# Altium footprint library Lib_001.PcbLib: 429 footprints (part 21 of 28)
Each footprint in its own frame and in the unit in brackets; x right, y up, seen from the top. Pads: shape width x height; smd on the part's side, far side on the other; paste and mask are expansions set on the pad; w line width, h text height; cw(c..) or ccw(c..) is an arc to the next point about the centre after c.
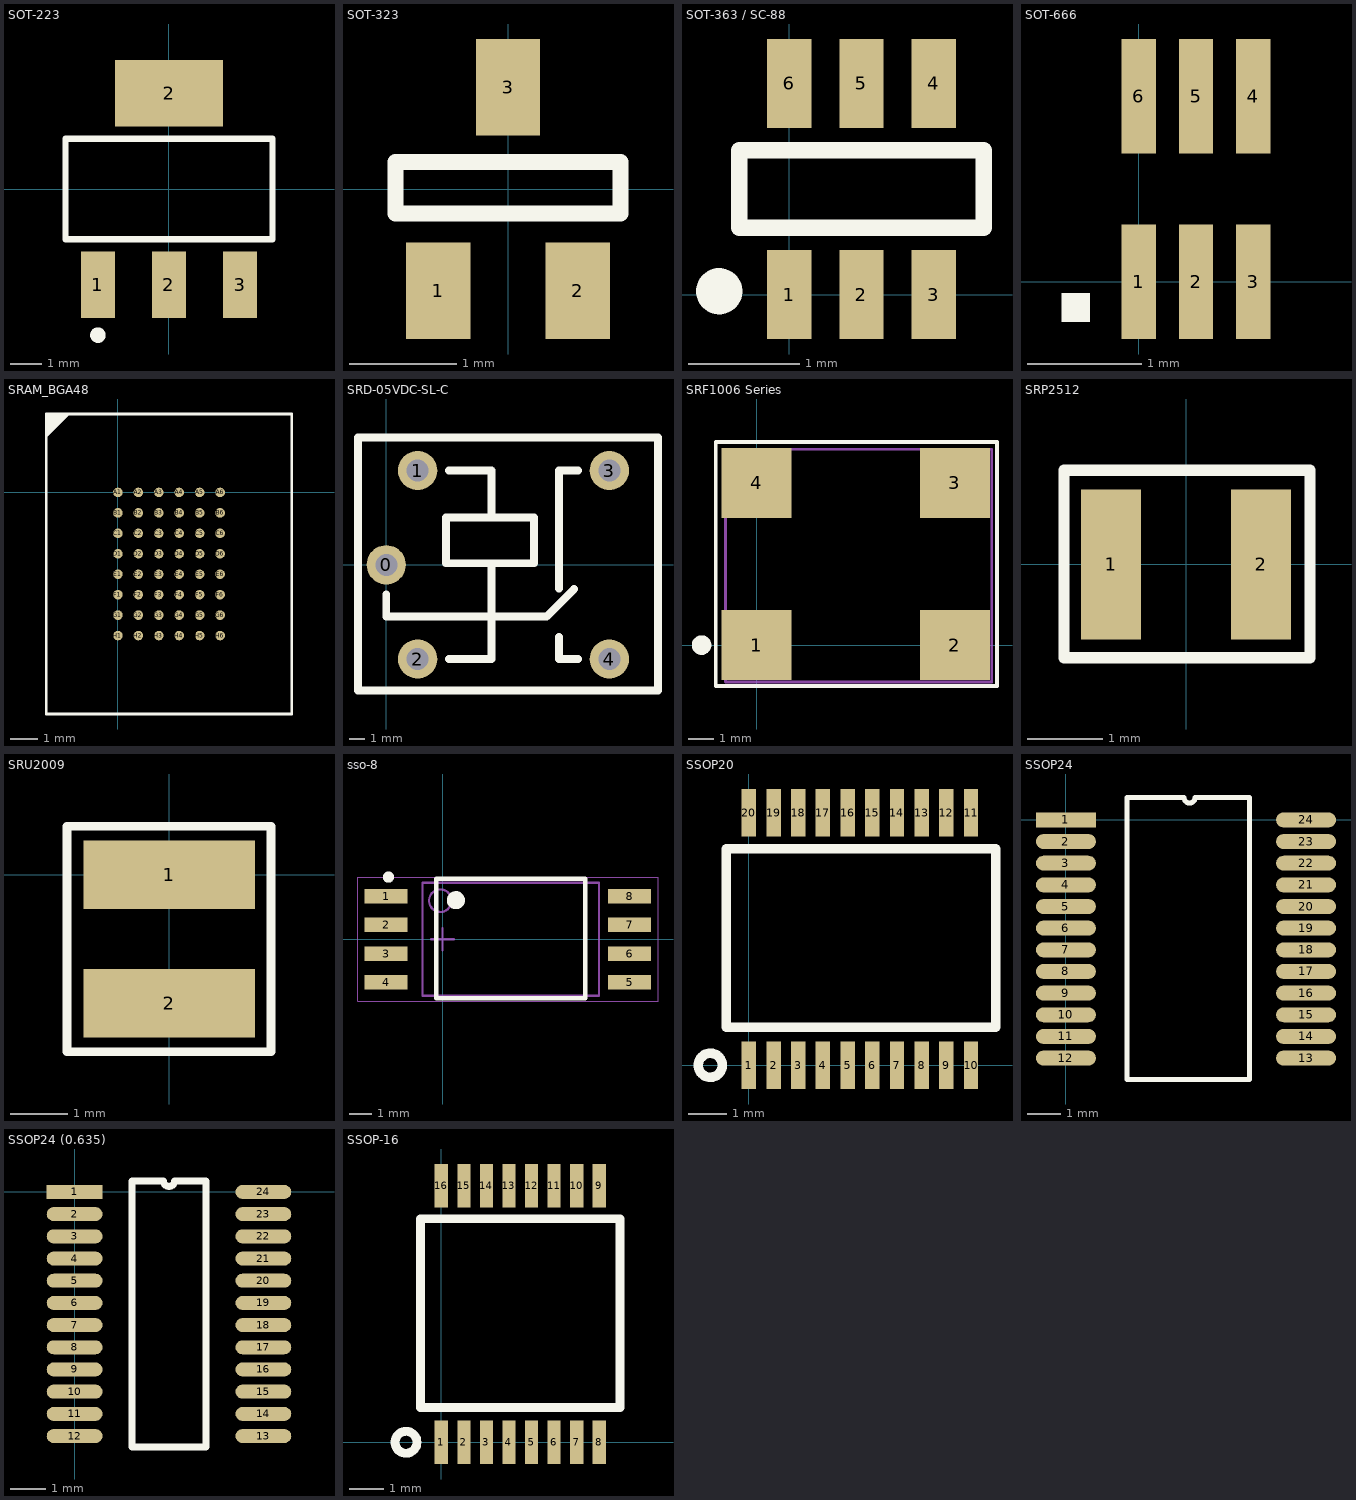
[diagram p20: the footprints below, top view; thin cyan lines are the x and y axes]

## SOT-223 [mm] "SOT-223/SC-73; 4 Leads; Body 6.7 x 7.3 mm, inc. leads (LxW max)"
height 1.8
pads (4):
  rect 1.1x2.15 smd: 1(-2.3,-3.1) 2(0,-3.1) 3(2.3,-3.1)
  rect 3.5x2.15 smd: 2(0,3.1)
Top Overlay:
  circle w0.25: c-2.3,-4.725 r0.125
  lines w0.2: -3.35,-1.625 -3.35,1.625 3.35,1.625 3.35,-1.625 -3.35,-1.625
3D body "User Library-SOT-223-4.STEP": height 1.65, standoff 0, extent -3.183,-3.894 3.317,3.192

## SOT-323 [mm]
pads (3):
  rect 0.6x0.9 smd: 1(-0.65,-0.95) 2(0.65,-0.95) 3(0,0.95)
Top Overlay:
  lines w0.15: -1.05,-0.23 1.05,-0.23 1.05,0.25 -1.05,0.25 -1.05,-0.23
3D body "User Library-sc70-3.STEP": height 1, standoff 0, extent -1.05,-1.15 1.05,1.15

## SOT-363 / SC-88 [mm]
pads (6):
  rect 0.4x0.8 smd: 1(0,0) 2(0.65,0) 3(1.3,0) 4(1.3,1.9) 5(0.65,1.9) 6(0,1.9)
Top Overlay:
  circle w0.254: c-0.63,0.03 r0.081
  lines w0.15: -0.45,0.6 -0.45,1.3 1.75,1.3 1.75,0.6 -0.45,0.6
3D body "User Library-SW3dPS-SOT363.step": height 0.98, standoff -0.01, extent -0.34,-0.1 1.66,2

## SOT-666 [mm]
pads (6):
  rect 0.3x1 smd: 1(0,0) 2(0.5,0) 3(1,0) 4(1,1.62) 5(0.5,1.62) 6(0,1.62)
Top Overlay:
  rectangle: -0.675,-0.35 -0.425,-0.1
3D body "User Library-SOT50P160X60-6.STEP": height 0.6, standoff 0, extent -0.295,0.025 1.296,1.625

## SRAM_BGA48 [mm]
pads (48):
  round 0.35 smd: A1(0,0) A2(0.75,0) A3(1.5,0) A4(2.25,0) A5(3,0) A6(3.75,0) B1(0,-0.75) B2(0.75,-0.75) B3(1.5,-0.75) B4(2.25,-0.75) B5(3,-0.75) B6(3.75,-0.75) C1(0,-1.5) C2(0.75,-1.5) C3(1.5,-1.5) C4(2.25,-1.5) C5(3,-1.5) C6(3.75,-1.5) D1(0,-2.25) D2(0.75,-2.25) D3(1.5,-2.25) D4(2.25,-2.25) D5(3,-2.25) D6(3.75,-2.25) E1(0,-3) E2(0.75,-3) E3(1.5,-3) E4(2.25,-3) E5(3,-3) E6(3.75,-3) F1(0,-3.75) F2(0.75,-3.75) F3(1.5,-3.75) F4(2.25,-3.75) F5(3,-3.75) F6(3.75,-3.75) G1(0,-4.5) G2(0.75,-4.5) G3(1.5,-4.5) G4(2.25,-4.5) G5(3,-4.5) G6(3.75,-4.5) H1(0,-5.25) H2(0.75,-5.25) H3(1.5,-5.25) H4(2.25,-5.25) H5(3,-5.25) H6(3.75,-5.25)
Top Overlay:
  region: -2.625,2.875 -1.755,2.875 -1.755,2.87 -2.625,2
  lines w0.1: -2.625,-8.125 6.375,-8.125 6.375,2.875 -2.625,2.875 -2.625,-8.125
3D body: height 1.2, standoff 0.24, extent -2.625,-8.125 6.375,2.875
3D body: height 0.34, standoff -0.14, extent -0.237,-3.239 0.24,-2.761
3D body: height 0.34, standoff -0.14, extent 0.513,-3.239 0.99,-2.761
3D body: height 0.34, standoff -0.14, extent 2.013,-3.239 2.49,-2.761
3D body: height 0.34, standoff -0.14, extent 1.263,-3.239 1.74,-2.761
3D body: height 0.34, standoff -0.14, extent 3.513,-3.239 3.99,-2.761
3D body: height 0.34, standoff -0.14, extent 2.763,-3.239 3.24,-2.761
3D body: height 0.34, standoff -0.14, extent 2.763,-3.989 3.24,-3.511
3D body: height 0.34, standoff -0.14, extent 3.513,-3.989 3.99,-3.511
3D body: height 0.34, standoff -0.14, extent 1.263,-3.989 1.74,-3.511
3D body: height 0.34, standoff -0.14, extent 2.013,-3.989 2.49,-3.511
3D body: height 0.34, standoff -0.14, extent 0.513,-3.989 0.99,-3.511
3D body: height 0.34, standoff -0.14, extent -0.237,-3.989 0.24,-3.511
3D body: height 0.34, standoff -0.14, extent -0.237,-5.489 0.24,-5.011
3D body: height 0.34, standoff -0.14, extent 0.513,-5.489 0.99,-5.011
3D body: height 0.34, standoff -0.14, extent 2.013,-5.489 2.49,-5.011
3D body: height 0.34, standoff -0.14, extent 1.263,-5.489 1.74,-5.011
3D body: height 0.34, standoff -0.14, extent 3.513,-5.489 3.99,-5.011
3D body: height 0.34, standoff -0.14, extent 2.763,-5.489 3.24,-5.011
3D body: height 0.34, standoff -0.14, extent 2.763,-4.739 3.24,-4.261
3D body: height 0.34, standoff -0.14, extent 3.513,-4.739 3.99,-4.261
3D body: height 0.34, standoff -0.14, extent 1.263,-4.739 1.74,-4.261
3D body: height 0.34, standoff -0.14, extent 2.013,-4.739 2.49,-4.261
3D body: height 0.34, standoff -0.14, extent 0.513,-4.739 0.99,-4.261
3D body: height 0.34, standoff -0.14, extent -0.237,-4.739 0.24,-4.261
3D body: height 0.34, standoff -0.14, extent -0.237,-1.739 0.24,-1.261
3D body: height 0.34, standoff -0.14, extent 0.513,-1.739 0.99,-1.261
3D body: height 0.34, standoff -0.14, extent 2.013,-1.739 2.49,-1.261
3D body: height 0.34, standoff -0.14, extent 1.263,-1.739 1.74,-1.261
3D body: height 0.34, standoff -0.14, extent 3.513,-1.739 3.99,-1.261
3D body: height 0.34, standoff -0.14, extent 2.763,-1.739 3.24,-1.261
3D body: height 0.34, standoff -0.14, extent 2.763,-2.489 3.24,-2.011
3D body: height 0.34, standoff -0.14, extent 3.513,-2.489 3.99,-2.011
3D body: height 0.34, standoff -0.14, extent 1.263,-2.489 1.74,-2.011
3D body: height 0.34, standoff -0.14, extent 2.013,-2.489 2.49,-2.011
3D body: height 0.34, standoff -0.14, extent 0.513,-2.489 0.99,-2.011
3D body: height 0.34, standoff -0.14, extent -0.237,-2.489 0.24,-2.011
3D body: height 0.34, standoff -0.14, extent -0.237,-0.989 0.24,-0.511
3D body: height 0.34, standoff -0.14, extent 0.513,-0.989 0.99,-0.511
3D body: height 0.34, standoff -0.14, extent 2.013,-0.989 2.49,-0.511
3D body: height 0.34, standoff -0.14, extent 1.263,-0.989 1.74,-0.511
3D body: height 0.34, standoff -0.14, extent 3.513,-0.989 3.99,-0.511
3D body: height 0.34, standoff -0.14, extent 2.763,-0.989 3.24,-0.511
3D body: height 0.34, standoff -0.14, extent 2.763,-0.239 3.24,0.239
3D body: height 0.34, standoff -0.14, extent 3.513,-0.239 3.99,0.239
3D body: height 0.34, standoff -0.14, extent 1.263,-0.239 1.74,0.239
3D body: height 0.34, standoff -0.14, extent 2.013,-0.239 2.49,0.239
3D body: height 0.28, standoff -0.08, extent 0.572,-0.179 0.93,0.179
3D body: height 0.28, standoff -0.08, extent -0.178,-0.179 0.18,0.18

## SRD-05VDC-SL-C [mm]
pads (5):
  round 2.5 hole 1.4: 0(0,0) 1(2,6) 2(2,-6) 3(14.2,6) 4(14.2,-6)
Top Overlay:
  lines w0.5: 0,-1.9 0,-3.3 10.2,-3.3 11.95,-1.55 ; 4,-6 6.7,-6 6.7,0.1 ; 4,6 6.7,6 6.7,3 ; 11,-4.6 11,-6 12.2,-6 ; 11,-1.5 11,6 12.2,6 ; -1.8,-8 17.3,-8 17.3,8.1 -1.8,8.1 -1.8,0 -1.8,-8 ; 3.8,0.1 9.4,0.1 9.4,3 3.8,3 3.8,0.1

## SRF1006 Series [mm] "Line Filter"
pads (4):
  rect 2.7x2.7 smd: 1(0,0) 2(7.675,0) 3(7.675,6.275) 4(0,6.275)
Top Overlay:
  circle w0.4: c-2.125,0 r0.177
  lines w0.15: -1.575,-1.575 9.3,-1.575 9.3,7.85 -1.575,7.85 -1.575,-1.575
Mechanical 1:
  lines w0.1: -1.2,-1.425 -1.2,7.575 9.1,7.575 9.1,-1.425 -1.2,-1.425
3D body: height 6.5, standoff 0, extent -1.2,-1.425 9.1,7.575

## SRP2512 [mm]
pads (2):
  rect 0.8x2 smd: 1(-1,0) 2(1,0)
Top Overlay:
  lines w0.15: -1.626,-1.247 1.655,-1.247 1.655,1.255 -1.626,1.255 -1.626,-1.247
3D body "User Library-SRP2512.STEP": height 1.2, standoff 0, extent -1.205,-1 1.205,1

## SRU2009 [mm] "SRU2009 Series - Shielded SMD Power Inductors"
pads (2):
  rect 3x1.2 smd: 1(0,0) 2(0,-2.25)
Top Overlay:
  lines w0.15: -1.79,-3.1 -1.79,0.85 1.78,0.85 1.78,-3.1 -1.79,-3.1
3D body "sru2009-2r2y.stp": height 0.9, standoff 0, extent -1.967,-3.157 2.007,0.817

## sso-8 [mm] "Stretched SO-8 Package  (Вытянутый SO-8)"
pads (8):
  rect 1.905x0.64 smd: 1(-2.502,1.897) 2(-2.502,0.627) 3(-2.502,-0.643) 4(-2.502,-1.913) 5(8.291,-1.913) 6(8.291,-0.643) 7(8.291,0.627) 8(8.291,1.897)
Top Overlay:
  circle w0.25: c-2.4,2.747 r0.125
  lines w0.2: -0.279,-2.616 6.325,-2.616 6.325,2.667 -0.279,2.667 -0.279,-2.616
  lines w0.4: 0.788,1.723 cw(c0.588,1.723) 0.788,1.729
Mechanical 13:
  circle w0.1: c-0.102,1.702 r0.5
  lines w0.1: -0.889,-2.508 6.934,-2.508 6.934,2.492 -0.889,2.492 -0.889,-2.508
Mechanical 15:
  lines w0.05: -3.75,-2.758 9.55,-2.758 9.55,2.742 -3.75,2.742 -3.75,-2.758
  lines w0.1: -0.5,-0.008 0.5,-0.008 ; 0,-0.508 0,0.492
3D body "User Library-SSO-8.step": height 3.39, standoff 0.01, extent -2.804,-2.878 8.696,2.972

## SSOP20 [mm]
pads (20):
  rect 0.38x1.25 smd: 1(0,0) 2(0.65,0) 3(1.3,0) 4(1.95,0) 5(2.6,0) 6(3.25,0) 7(3.9,0) 8(4.55,0) 9(5.2,0) 10(5.85,0) 11(5.85,6.65) 12(5.2,6.65) 13(4.55,6.65) 14(3.9,6.65) 15(3.25,6.65) 16(2.6,6.65) 17(1.95,6.65) 18(1.3,6.65) 19(0.65,6.65) 20(0,6.65)
Top Overlay:
  circle w0.254: c-1.016,0 r0.316
  lines w0.254: -0.6,1 -0.6,5.7 6.5,5.7 6.5,1 -0.6,1
3D body: height 1.8, standoff 0.21, extent -0.6,1 6.5,5.7
3D body: height 1.85, standoff 1.75, extent -0.396,1.301 0.6,2.299
3D body: height 1.85, standoff 1.75, extent -0.396,1.301 0.6,2.299

## SSOP24 [mm]
pads (24):
  rect 1.8x0.45 smd: 1(0,0)
  oval 1.8x0.45 smd: 2(0,-0.65) 3(0,-1.3) 4(0,-1.95) 5(0,-2.6) 6(0,-3.25) 7(0,-3.9) 8(0,-4.55) 9(0,-5.2) 10(0,-5.85) 11(0,-6.5) 12(0,-7.15) 13(7.205,-7.15) 14(7.205,-6.5) 15(7.205,-5.85) 16(7.205,-5.2) 17(7.205,-4.55) 18(7.205,-3.9) 19(7.205,-3.25) 20(7.205,-2.6) 21(7.205,-1.95) 22(7.205,-1.3) 23(7.205,-0.65) 24(7.205,0)
Top Overlay:
  lines w0.15: 3.546,0.674 1.827,0.674 1.828,-7.799 5.503,-7.799 5.503,0.674 3.871,0.674 ; 3.547,0.666 ccw(c3.709,0.666) 3.872,0.666
3D body "User Library-SSOP 24 PIN_.step": height 1.98, standoff -0.01, extent -0.351,-7.883 7.549,0.747

## SSOP24 (0.635) [mm]
pads (24):
  rect 1.6x0.4 smd: 1(0,0)
  oval 1.6x0.4 smd: 2(0,-0.635) 3(0,-1.27) 4(0,-1.905) 5(0,-2.54) 6(0,-3.175) 7(0,-3.81) 8(0,-4.445) 9(0,-5.08) 10(0,-5.715) 11(0,-6.35) 12(0,-6.985) 13(5.4,-6.985) 14(5.4,-6.35) 15(5.4,-5.715) 16(5.4,-5.08) 17(5.4,-4.445) 18(5.4,-3.81) 19(5.4,-3.175) 20(5.4,-2.54) 21(5.4,-1.905) 22(5.4,-1.27) 23(5.4,-0.635) 24(5.4,0)
Top Overlay:
  lines w0.2: 1.635,-7.302 3.765,-7.302 3.765,0.318 2.859,0.318 cw(c2.7,0.318) 2.541,0.318 1.635,0.318 1.635,-7.302
3D body "User Library-User Library-TSSOP-24.step": height 1.2, standoff 0, extent -0.488,-7.434 6.062,0.466

## SSOP48 [mm]

## SSOP48 - duplicate [mm]
3D body "User Library-SSOP48.STEP": height 0.3, standoff -2.35, extent -1.075,-14.039 9.325,1.961

## SSOP-16 [mm]
pads (16):
  rect 0.38x1.25 smd: 1(0,0) 2(0.65,0) 3(1.3,0) 4(1.95,0) 5(2.6,0) 6(3.25,0) 7(3.9,0) 8(4.55,0) 9(4.55,7.39) 10(3.9,7.39) 11(3.25,7.39) 12(2.6,7.39) 13(1.95,7.39) 14(1.3,7.39) 15(0.65,7.39) 16(0,7.39)
Top Overlay:
  circle w0.254: c-1.016,0 r0.316
  lines w0.254: -0.6,6.38 -0.6,1 5.15,1 5.15,6.39 ; -0.6,6.44 5.15,6.44
3D body: height 1.85, standoff 1.75, extent -0.396,1.301 0.6,2.299